# Altium footprint library myPcb.PcbLib: 145 footprints (part 8 of 10)
Each footprint in its own frame and in the unit in brackets; x right, y up, seen from the top. Pads: shape width x height; smd on the part's side, far side on the other; paste and mask are expansions set on the pad; w line width, h text height; cw(c..) or ccw(c..) is an arc to the next point about the centre after c.
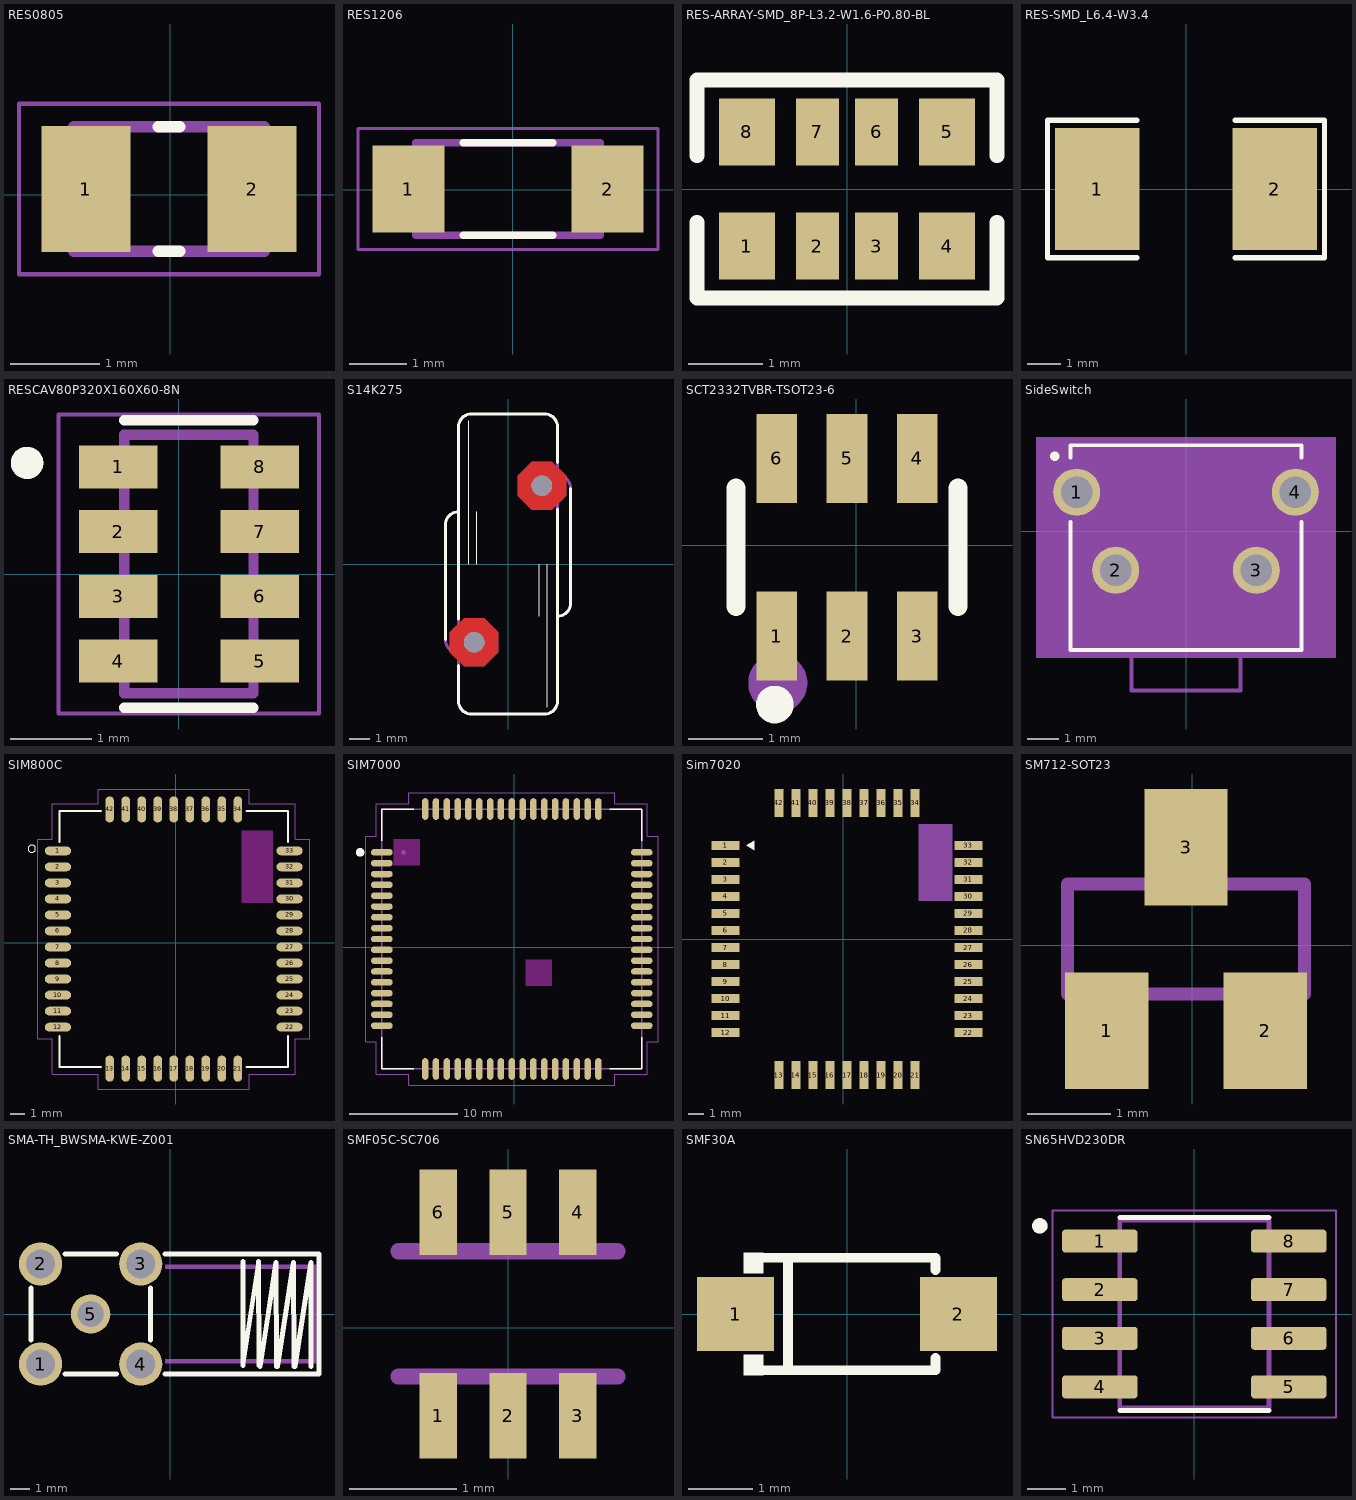
[diagram p7: the footprints below, top view; thin cyan lines are the x and y axes]

## RES0805 [mm]
pads (2):
  rect 1x1.42 smd: 1(-0.947,0.066) 2(0.923,0.066)
Top Overlay:
  lines w0.127: -0.132,-0.634 0.108,-0.634 ; -0.132,0.766 0.108,0.766
Mechanical 13:
  lines w0.127: -1.082,-0.634 -1.082,0.766 1.058,0.766 1.058,-0.634 -1.082,-0.634
Mechanical 15:
  lines w0.05: -1.697,-0.894 -1.697,1.026 1.673,1.026 1.673,-0.894 -1.697,-0.894
3D body "step_temp.STEP": height 0.6, standoff 0, extent -1.012,-0.559 0.988,0.691

## RES1206 [mm]
pads (2):
  rect 1.25x1.5 smd: 1(-1.811,0.017) 2(1.639,0.017)
Top Overlay:
  lines w0.127: -0.866,-0.783 0.694,-0.783 ; -0.866,0.817 0.694,0.817
Mechanical 13:
  lines w0.127: -1.686,-0.783 1.514,-0.783 1.514,0.817 -1.686,0.817 -1.686,-0.783
Mechanical 15:
  lines w0.05: -2.686,-1.033 2.514,-1.033 2.514,1.067 -2.686,1.067 -2.686,-1.033

## RES-ARRAY-SMD_8P-L3.2-W1.6-P0.80-BL [mm]
pads (8):
  rect 0.75x0.9 smd paste+0 mask+0.051: 1(-1.35,-0.77) 4(1.35,-0.77) 5(1.35,0.77) 8(-1.35,0.77)
  rect 0.58x0.9 smd paste+0 mask+0.051: 2(-0.4,-0.77) 3(0.4,-0.77) 6(0.4,0.77) 7(-0.4,0.77)
Top Overlay:
  lines w0.2: -2.025,-0.45 -2.025,-1.47 2.025,-1.47 2.025,-0.45 ; -2.025,0.45 -2.025,1.47 2.025,1.47 2.025,0.45

## RES-SMD_L6.4-W3.4 [mm] "1毫欧取样电阻"
pads (2):
  rect 2.535x3.672 smd paste+0 mask+0.051: 1(-2.668,0) 2(2.668,0)
Top Overlay:
  lines w0.152: -1.476,-2.065 -4.164,-2.065 -4.164,2.065 -1.476,2.065 ; 1.476,-2.065 4.164,-2.065 4.164,2.065 1.476,2.065

## RESCAV80P320X160X60-8N [mm] "阻排"
pads (8):
  rect 0.97x0.53 smd: 1(-0.748,1.327) 2(-0.748,0.527) 3(-0.748,-0.273) 4(-0.748,-1.073) 5(1.002,-1.073) 6(1.002,-0.273) 7(1.002,0.527) 8(1.002,1.327)
Top Overlay:
  circle w0.2: c-1.873,1.377 r0.1
  lines w0.127: -0.673,-1.652 0.927,-1.652 ; -0.673,1.906 0.927,1.906
Mechanical 13:
  circle w0.2: c-1.873,1.377 r0.1
  lines w0.127: -0.673,-1.473 0.927,-1.473 0.927,1.727 -0.673,1.727 -0.673,-1.473
Mechanical 15:
  lines w0.05: -1.483,-1.723 1.737,-1.723 1.737,1.977 -1.483,1.977 -1.483,-1.723
3D body "step_temp.STEP": height 0.6, standoff 0, extent -1.473,-0.648 1.727,0.902

## S14K275 [mil]
pads (2):
  round 39.36 hole 39.36 unplated paste+0: ""(-65,-150) ""(65,150)
Top Layer:
  region: 111.19,169.13 84.13,196.19 45.87,196.19 18.81,169.13 18.81,130.87 45.87,103.81 84.13,103.81 111.19,130.87
  region: -18.81,-130.87 -45.87,-103.81 -84.13,-103.81 -111.19,-130.87 -111.19,-169.13 -84.13,-196.19 -45.87,-196.19 -18.81,-169.13
Bottom Layer:
  region: 111.19,169.13 84.13,196.19 45.87,196.19 18.81,169.13 18.81,130.87 45.87,103.81 84.13,103.81 111.19,130.87
  region: -18.81,-130.87 -45.87,-103.81 -84.13,-103.81 -111.19,-130.87 -111.19,-169.13 -84.13,-196.19 -45.87,-196.19 -18.81,-169.13
Top Overlay:
  lines w2: -75,0 -75,275 ; -60,0 -60,100 ; 60,-100 60,0 ; 75,-275 75,0
  lines w6: -120,-145 -120,75 cw(c-95,75) -95,100 ; -95,-195 -95,-262.5 ccw(c-70,-262.5) -70,-287.5 70,-287.5 ccw(c70,-262.5) 95,-262.5 95,105 ; -95,-105 -95,262.5 cw(c-70,262.5) -70,287.5 70,287.5 cw(c70,262.5) 95,262.5 95,195 ; 95,-100 ccw(c95,-75) 120,-75 120,145
Mechanical 15:
  lines w6: -120,-145 ccw(c-95,-145) -95,-170 ; -95,-195 -95,-105 ; 95,105 95,195 ; 95,170 cw(c95,145) 120,145
Multi-Layer:
  region: 111.19,169.13 84.13,196.19 45.87,196.19 18.81,169.13 18.81,130.87 45.87,103.81 84.13,103.81 111.19,130.87
  region: -18.81,-130.87 -45.87,-103.81 -84.13,-103.81 -111.19,-130.87 -111.19,-169.13 -84.13,-196.19 -45.87,-196.19 -18.81,-169.13

## SCT2332TVBR-TSOT23-6 [mm] "SCT2332TVBR"
pads (6):
  rect 0.55x1.2 smd paste+0 mask+0.051: 1(-1.077,-1.228) 2(-0.127,-1.228) 3(0.823,-1.228) 4(0.823,1.172) 5(-0.127,1.172) 6(-1.077,1.172)
Top Overlay:
  circle w0.254: c-1.102,-2.153 r0.127
  lines w0.254: -1.627,-0.828 -1.627,0.772 ; 1.373,-0.828 1.373,0.772
Mechanical 15:
  circle w0.4: c-1.061,-1.86 r0.2

## SideSwitch [mm] "侧方位按钮"
pads (4):
  round 1.508 hole 1: 1(-3.5,1.25) 2(-2.25,-1.25) 3(2.25,-1.25) 4(3.5,1.25)
Top Overlay:
  circle w0.2: c-4.2,2.4 r0.05
  lines w0.127: -3.7,0.3 -3.7,-3.8 3.7,-3.8 3.7,0.3 ; -3.7,2.36 -3.7,2.75 3.7,2.75 3.7,2.36
Mechanical 13:
  lines w0.127: -3.7,-3.8 -3.7,2.75 ; -1.75,-3.8 -1.75,-5.1 1.75,-5.1 1.75,-3.8 ; 3.7,-3.8 3.7,2.75
Mechanical 15:
  region: 4.8,-4.05 -4.8,-4.05 -4.8,3 4.8,3

## SIM800C [mm]
pads (42):
  oval 1.8x0.6 smd: 1(-8.077,6.304) 2(-8.077,5.204) 3(-8.077,4.104) 4(-8.077,3.004) 5(-8.077,1.904) 6(-8.077,0.804) 7(-8.077,-0.296) 8(-8.077,-1.396) 9(-8.077,-2.496) 10(-8.077,-3.596) 11(-8.077,-4.696) 12(-8.077,-5.796) 22(7.823,-5.796) 23(7.823,-4.696) 24(7.823,-3.596) 25(7.823,-2.496) 26(7.823,-1.396) 27(7.823,-0.296) 28(7.823,0.804) 29(7.823,1.904) 30(7.823,3.004) 31(7.823,4.104) 32(7.823,5.204) 33(7.823,6.304)
  oval 0.6x1.8 smd: 13(-4.527,-8.646) 14(-3.427,-8.646) 15(-2.327,-8.646) 16(-1.227,-8.646) 17(-0.127,-8.646) 18(0.973,-8.646) 19(2.073,-8.646) 20(3.173,-8.646) 21(4.273,-8.646) 34(4.273,9.154) 35(3.173,9.154) 36(2.073,9.154) 37(0.973,9.154) 38(-0.127,9.154) 39(-1.227,9.154) 40(-2.327,9.154) 41(-3.427,9.154) 42(-4.527,9.154)
Top Overlay:
  circle w0: c-9.877,6.454 r0.254
  lines w0.127: -7.977,-6.396 -7.977,-8.546 -5.127,-8.546 ; -7.977,6.904 -7.977,9.054 -5.127,9.054 ; 4.873,-8.546 7.723,-8.546 7.723,-6.396 ; 4.873,9.054 7.723,9.054 7.723,6.904
Keep-Out Layer:
  region: 6.673,2.737 4.529,2.737 4.529,7.684 6.673,7.684
Mechanical 15:
  lines w0.05: -9.477,-6.596 -9.477,7.104 -8.477,7.104 -8.477,9.554 -5.327,9.554 -5.327,10.554 5.073,10.554 5.073,9.554 8.223,9.554 8.223,7.104 9.223,7.104 9.223,-6.596 8.223,-6.596 8.223,-9.046 5.073,-9.046 5.073,-10.046 -5.327,-10.046 -5.327,-9.046 -8.477,-9.046 -8.477,-6.596 -9.477,-6.596
3D body "step_temp.STEP": height 2.5, standoff 0, extent -7.977,-8.546 7.723,9.054

## SIM7000 [mm]
pads (68):
  oval 2x0.6 smd: 1(-12.227,8.746) 2(-12.227,7.746) 3(-12.227,6.746) 4(-12.227,5.746) 5(-12.227,4.746) 6(-12.227,3.746) 7(-12.227,2.746) 8(-12.227,1.746) 9(-12.227,0.746) 10(-12.227,-0.254) 11(-12.227,-1.254) 12(-12.227,-2.254) 13(-12.227,-3.254) 14(-12.227,-4.254) 15(-12.227,-5.254) 16(-12.227,-6.254) 17(-12.227,-7.254) 35(11.773,-7.254) 36(11.773,-6.254) 37(11.773,-5.254) 38(11.773,-4.254) 39(11.773,-3.254) 40(11.773,-2.254) 41(11.773,-1.254) 42(11.773,-0.254) 43(11.773,0.746) 44(11.773,1.746) 45(11.773,2.746) 46(11.773,3.746) 47(11.773,4.746) 48(11.773,5.746) 49(11.773,6.746) 50(11.773,7.746) 51(11.773,8.746)
  oval 0.6x2 smd: 18(-8.227,-11.254) 19(-7.227,-11.254) 20(-6.227,-11.254) 21(-5.227,-11.254) 22(-4.227,-11.254) 23(-3.227,-11.254) 24(-2.227,-11.254) 25(-1.227,-11.254) 26(-0.227,-11.254) 27(0.773,-11.254) 28(1.773,-11.254) 29(2.773,-11.254) 30(3.773,-11.254) 31(4.773,-11.254) 32(5.773,-11.254) 33(6.773,-11.254) 34(7.773,-11.254) 52(7.773,12.746) 53(6.773,12.746) 54(5.773,12.746) 55(4.773,12.746) 56(3.773,12.746) 57(2.773,12.746) 58(1.773,12.746) 59(0.773,12.746) 60(-0.227,12.746) 61(-1.227,12.746) 62(-2.227,12.746) 63(-3.227,12.746) 64(-4.227,12.746) 65(-5.227,12.746) 66(-6.227,12.746) 67(-7.227,12.746) 68(-8.227,12.746)
Top Overlay:
  circle w0.4: c-14.227,8.746 r0.2
  lines w0.127: -12.227,-8.304 -12.227,-11.254 -9.277,-11.254 ; -12.227,9.796 -12.227,12.746 -9.277,12.746 ; 8.823,-11.254 11.773,-11.254 11.773,-8.304 ; 8.823,12.746 11.773,12.746 11.773,9.796
Keep-Out Layer:
  region: -8.727,7.553 -11.138,7.553 -11.138,9.946 -8.727,9.946
  region: 3.473,-3.559 1.074,-3.559 1.074,-1.154 3.473,-1.154
Mechanical 13:
  circle w0.2: c-10.227,8.746 r0.1
  lines w0.127: -12.227,-11.254 11.773,-11.254 11.773,12.746 -12.227,12.746 -12.227,-11.254
Mechanical 15:
  lines w0.05: -13.727,-8.754 -12.727,-8.754 -12.727,-11.754 -9.727,-11.754 -9.727,-12.754 9.273,-12.754 9.273,-11.754 12.273,-11.754 12.273,-8.754 13.273,-8.754 13.273,10.246 12.273,10.246 12.273,13.246 9.273,13.246 9.273,14.246 -9.727,14.246 -9.727,13.246 -12.727,13.246 -12.727,10.246 -13.727,10.246 -13.727,-8.754

## Sim7020 [mm]
pads (42):
  rect 1.8x0.6 smd: 1(-7.619,6.063) 2(-7.619,4.963) 3(-7.619,3.863) 4(-7.619,2.763) 5(-7.619,1.663) 6(-7.619,0.563) 7(-7.619,-0.537) 8(-7.619,-1.637) 9(-7.619,-2.737) 10(-7.619,-3.837) 11(-7.619,-4.937) 12(-7.619,-6.037) 22(8.081,-6.037) 23(8.081,-4.937) 24(8.081,-3.837) 25(8.081,-2.737) 26(8.081,-1.637) 27(8.081,-0.537) 28(8.081,0.563) 29(8.081,1.663) 30(8.081,2.763) 31(8.081,3.863) 32(8.081,4.963) 33(8.081,6.063)
  rect 0.6x1.8 smd: 13(-4.169,-8.787) 14(-3.069,-8.787) 15(-1.969,-8.787) 16(-0.869,-8.787) 17(0.231,-8.787) 18(1.331,-8.787) 19(2.431,-8.787) 20(3.531,-8.787) 21(4.631,-8.787) 34(4.631,8.813) 35(3.531,8.813) 36(2.431,8.813) 37(1.331,8.813) 38(0.231,8.813) 39(-0.869,8.813) 40(-1.969,8.813) 41(-3.069,8.813) 42(-4.169,8.813)
Top Overlay:
  region: -5.769,5.763 -6.269,6.063 -5.769,6.363
Mechanical 15:
  region: 7.031,2.493 4.881,2.493 4.881,7.443 7.031,7.443

## SM712-SOT23 [mm] "SM712"
pads (3):
  rect 1x1.4 smd: 1(-1.027,-1.027) 2(0.873,-1.027) 3(-0.077,1.173)
Mechanical 13:
  region: 0.151,0.784 -0.306,0.784 -0.306,1.369 0.151,1.369
  region: 1.091,-1.222 0.634,-1.222 0.634,-0.638 1.091,-0.638
  region: -0.789,-1.222 -1.246,-1.222 -1.246,-0.638 -0.789,-0.638
  lines w0.152: -1.5,-0.587 1.345,-0.587 1.345,0.734 -1.5,0.734 -1.5,-0.587

## SMA-TH_BWSMA-KWE-Z001 [mm]
pads (5):
  round 2.2 hole 1.45 slot 1.455 at 0 deg paste+0 mask+0.051: 1(-6.604,-2.55) 2(-6.604,2.55) 3(-1.504,2.55) 4(-1.504,-2.55)
  round 2 hole 1.3 slot 1.305 at 0 deg paste+0 mask+0.051: 5(-4.053,0)
Top Overlay:
  lines w0.254: -7.101,-1.316 -7.101,1.316 ; -5.369,-3.048 -2.738,-3.048 ; -5.369,3.048 -2.738,3.048 ; -1.005,-1.316 -1.005,1.316 ; -0.269,-3.048 7.577,-3.048 ; -0.269,3.048 7.547,3.048 ; 3.693,2.667 3.693,-2.633 4.506,2.667 4.513,-2.633 ; 4.583,-2.667 5.395,2.633 5.402,-2.667 ; 5.472,-2.667 6.284,2.633 6.291,-2.667 ; 6.361,-2.667 7.173,2.633 7.18,-2.667 ; 7.577,-3 7.577,-2.62 7.577,2.68 7.577,3.048
Mechanical 15:
  region: 7.447,2.3 7.447,-2.3 7.247,-2.3 7.247,2.3
  region: -0.253,-2.5 7.447,-2.5 7.447,-2.3 -0.253,-2.3
  region: -0.253,2.5 7.447,2.5 7.447,2.3 -0.253,2.3

## SMF05C-SC706 [mm] "SMF05C"
pads (6):
  rect 0.35x0.8 smd paste-1 mask+0: 1(-0.65,-0.823) 2(0,-0.823) 3(0.65,-0.823) 4(0.65,1.077) 5(0,1.077) 6(-0.65,1.077)
Top Paste:
  region: -0.5,-1.199 -0.801,-1.199 -0.801,-0.448 -0.5,-0.448
  region: 0.15,-1.199 -0.15,-1.199 -0.15,-0.448 0.15,-0.448
  region: 0.8,-1.199 0.5,-1.199 0.5,-0.448 0.8,-0.448
  region: 0.8,0.702 0.5,0.702 0.5,1.452 0.8,1.452
  region: 0.15,0.702 -0.15,0.702 -0.15,1.452 0.15,1.452
  region: -0.5,0.703 -0.802,0.703 -0.802,1.452 -0.5,1.452
Top Solder:
  region: -0.425,-1.274 -0.875,-1.274 -0.875,-0.373 -0.425,-0.373
  region: 0.225,-1.274 -0.225,-1.274 -0.225,-0.373 0.225,-0.373
  region: 0.875,-1.275 0.426,-1.275 0.426,-0.373 0.875,-0.373
  region: 0.875,0.627 0.425,0.627 0.425,1.527 0.875,1.527
  region: 0.225,0.628 -0.225,0.628 -0.225,1.527 0.225,1.527
  region: -0.425,0.627 -0.875,0.627 -0.875,1.527 -0.425,1.527
Mechanical 13:
  region: 0.15,-1.073 -0.15,-1.073 -0.15,-0.498 0.15,-0.498
  region: -0.5,-1.075 -0.801,-1.075 -0.801,-0.498 -0.5,-0.498
  region: 0.8,-1.074 0.5,-1.074 0.5,-0.498 0.8,-0.498
  region: 0.8,0.753 0.501,0.753 0.501,1.327 0.8,1.327
  region: 0.15,0.753 -0.15,0.753 -0.15,1.327 0.15,1.327
  region: -0.5,0.753 -0.801,0.753 -0.801,1.327 -0.5,1.327
  lines w0.152: -1.022,-0.458 1.022,-0.458 ; -1.022,0.712 1.022,0.712

## SMF30A [mm]
pads (2):
  rect 1.2x1.15 smd paste+0 mask+0.051: 1(-1.735,0) 2(1.735,0)
Top Overlay:
  region: -1.3,0.952 -1.3,0.632 -1.605,0.632 -1.605,0.952
  region: -1.3,-0.952 -1.3,-0.632 -1.605,-0.632 -1.605,-0.952
  lines w0.152: -1.376,-0.876 1.376,-0.876 1.376,-0.683 ; -1.376,0.876 1.376,0.876 1.376,0.683 ; -0.917,-0.876 -0.917,0.876
Mechanical 15:
  region: -2.032,0.127 -2.032,-0.065 -1.264,-0.065 -1.264,0.127
  region: 2.035,0.096 2.035,-0.096 1.267,-0.096 1.267,0.096
  region: 1.747,-0.384 1.555,-0.384 1.555,0.384 1.747,0.384

## SN65HVD230DR [mm]
pads (8):
  rrect25% 1.97x0.6 smd: 1(-2.47,1.905) 2(-2.47,0.635) 3(-2.47,-0.635) 4(-2.47,-1.905) 5(2.47,-1.905) 6(2.47,-0.635) 7(2.47,0.635) 8(2.47,1.905)
Top Overlay:
  circle w0.2: c-4.04,2.305 r0.1
  lines w0.127: -1.95,-2.525 1.95,-2.525 ; -1.95,2.525 1.95,2.525
Mechanical 13:
  circle w0.2: c-4.04,2.305 r0.1
  lines w0.127: -1.95,-2.452 1.95,-2.452 1.95,2.452 -1.95,2.452 -1.95,-2.452
Mechanical 15:
  lines w0.05: -3.705,-2.702 3.705,-2.702 3.705,2.702 -3.705,2.702 -3.705,-2.702
3D body "step_temp.STEP": height 1.75, standoff 0, extent -2.997,-2.451 2.997,2.451